# Altium footprint library 5.10-TO直插元件封装.PcbLib: 63 footprints (part 4 of 4)
Each footprint in its own frame and in the unit in brackets; x right, y up, seen from the top. Pads: shape width x height; smd on the part's side, far side on the other; paste and mask are expansions set on the pad; w line width, h text height; cw(c..) or ccw(c..) is an arc to the next point about the centre after c.
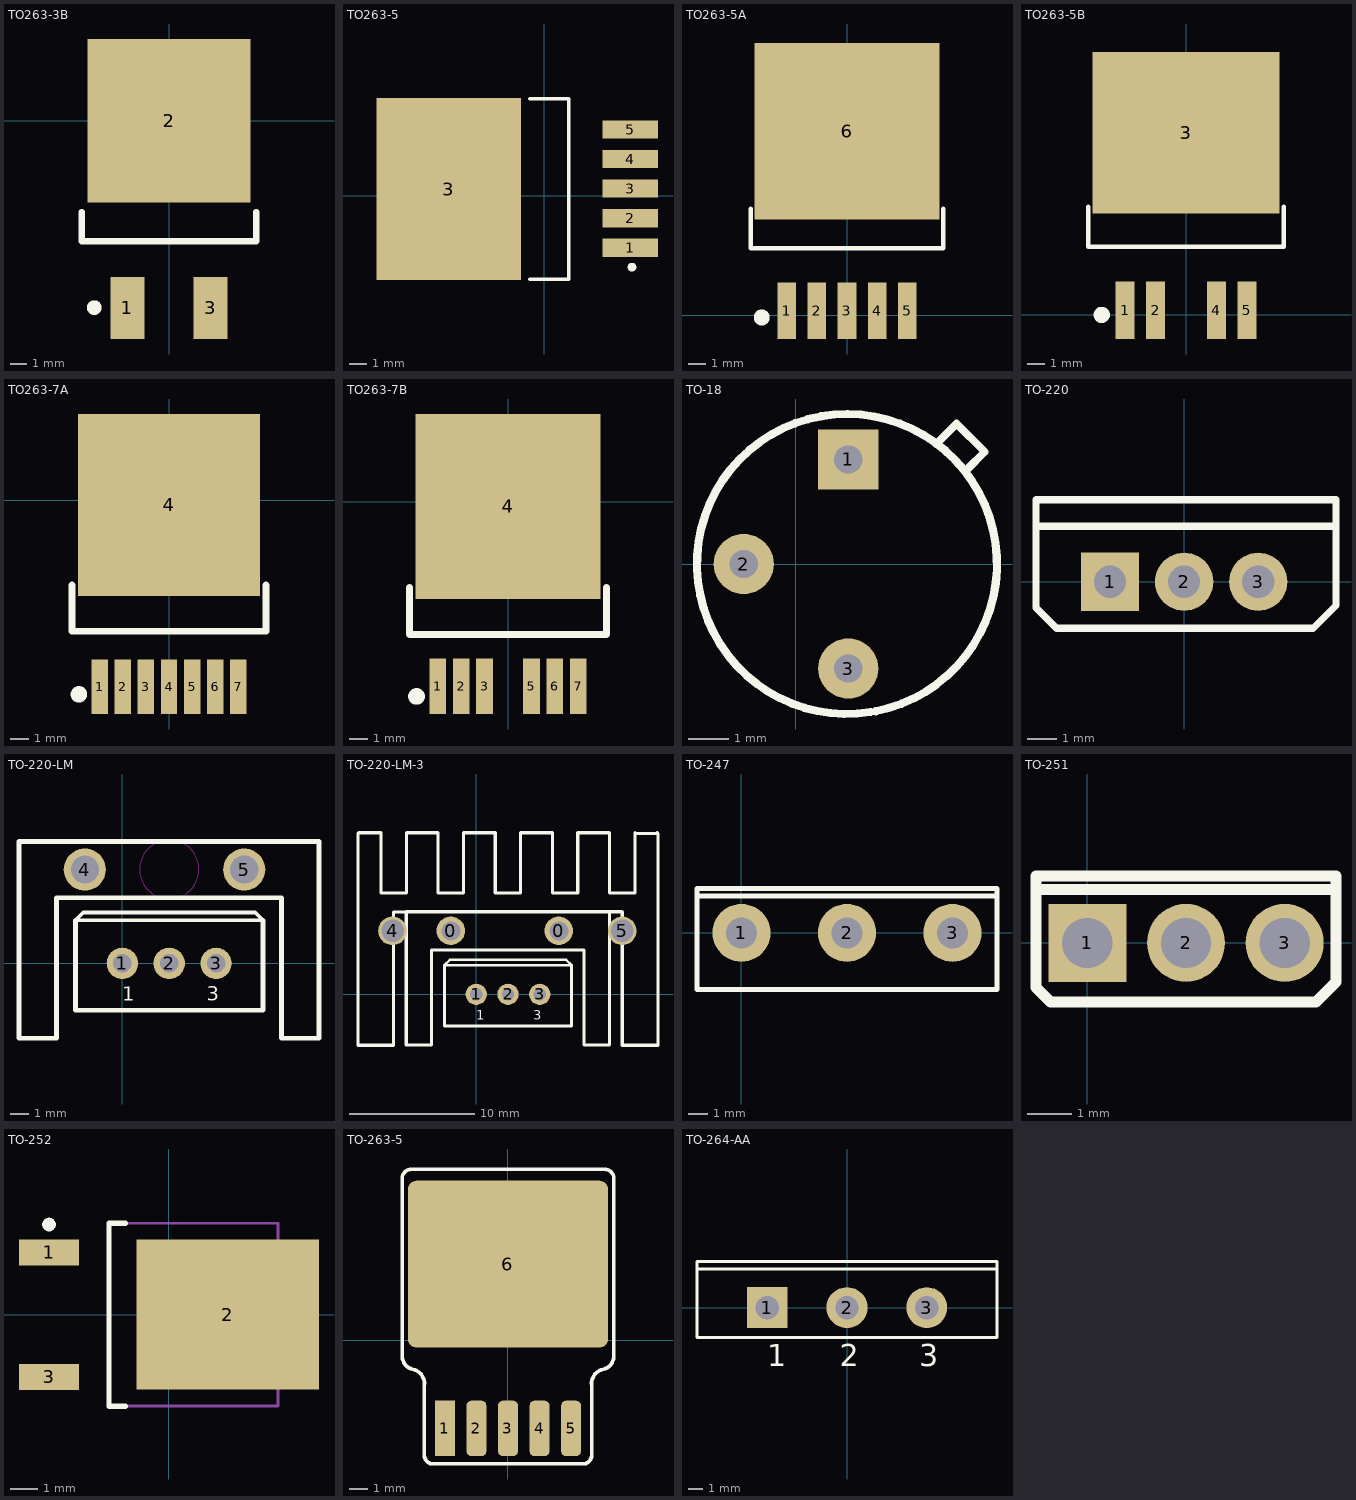
[diagram p3: the footprints below, top view; thin cyan lines are the x and y axes]

## TO263-3B [mm] "263，3脚晶体管      [ PCB学习群514746572 ]"
pads (3):
  rect 2.1x3.8 smd: 1(-2.54,-11.45) 3(2.54,-11.45)
  rect 10x10 smd: 2(0,0)
Top Overlay:
  circle w0.5: c-4.572,-11.43 r0.2
  lines w0.381: -5.334,-5.588 -5.334,-7.366 5.334,-7.366 5.334,-5.588
3D body "TO263-2.STEP": height 5.08, standoff 0.07, extent -4.953,-11.823 5.207,3.441

## TO263-5 [mm] "[ PCBѧϰȺ514746572 ]"
pads (6):
  rect 3.2x1.05 smd: 1(4.953,-2.997) 2(4.953,-1.297) 3(4.953,0.403) 4(4.953,2.103) 5(4.953,3.803)
  rect 8.3x10.45 smd: 3(-5.482,0.381)
Top Overlay:
  circle w0.25: c5.055,-4.115 r0.125
  lines w0.2: -0.83,-4.819 1.42,-4.819 1.42,5.581 -0.83,5.581
3D body "TO263-5A.STEP": height 4.5, standoff 0, extent -8.375,-4.572 4.953,5.428

## TO263-5A [mm] "263，5脚晶体管      [ PCB学习群514746572 ]"
pads (6):
  rect 1.05x3.2 smd: 1(-3.4,0.254) 2(-1.7,0.254) 3(0,0.254) 4(1.7,0.254) 5(3.4,0.254)
  rect 10.45x10 smd: 6(0,10.414)
Top Overlay:
  circle w0.5: c-4.826,-0.127 r0.2
  lines w0.254: -5.461,6.037 -5.461,3.787 5.461,3.787 5.461,6.037
3D body "TO263-5A.STEP": height 4.5, standoff 0, extent -5,0.244 5,13.571

## TO263-5B [mm] "263，5脚晶体管      [ PCB学习群514746572 ]"
pads (5):
  rect 1.05x3.2 smd: 1(-3.4,0.254) 2(-1.7,0.254) 4(1.7,0.254) 5(3.4,0.254)
  rect 10.45x9 smd: 3(0,10.16)
Top Overlay:
  circle w0.5: c-4.699,0 r0.2
  lines w0.254: -5.461,6.037 -5.461,3.787 5.461,3.787 5.461,6.037
3D body "TO263-5B.STEP": height 4.5, standoff 0, extent -5,0.117 5,13.445

## TO263-7A [mm] "263，7脚晶体管      [ PCB学习群514746572 ]"
pads (8):
  rect 0.9x3 smd: 1(-3.81,-10.246) 2(-2.54,-10.246) 3(-1.27,-10.246) 4(0,-10.246) 5(1.27,-10.246) 6(2.54,-10.246) 7(3.81,-10.246)
  rect 10x10 smd: 4(0,-0.254)
Top Overlay:
  circle w0.5: c-4.953,-10.668 r0.2
  lines w0.381: -5.334,-4.658 -5.334,-7.198 5.334,-7.198 5.334,-4.658
3D body "TO263-7A.STEP": height 4.4, standoff 0, extent -5,-10.256 5,3.071

## TO263-7B [mm] "263，7脚晶体管      [ PCB学习群514746572 ]"
pads (7):
  rect 0.9x3 smd: 1(-3.81,-9.992) 2(-2.54,-9.992) 3(-1.27,-9.992) 5(1.27,-9.992) 6(2.54,-9.992) 7(3.81,-9.992)
  rect 10x10 smd: 4(0,-0.254)
Top Overlay:
  circle w0.5: c-4.953,-10.541 r0.2
  lines w0.381: -5.334,-4.658 -5.334,-7.198 5.334,-7.198 5.334,-4.658
3D body "TO263-7B.STEP": height 4.4, standoff 0, extent -5,-10.668 5,2.66

## TO-18 [mm] "[ PCBѧϰȺ514746572 ]"
pads (3):
  rect 1.5x1.5 hole 0.7: 1(1.302,2.603)
  round 1.5 hole 0.7: 2(-1.302,0) 3(1.302,-2.603)
Top Overlay:
  lines w0.2: 3.492,2.984 4,3.492 4.699,2.794 4.255,2.349
  lines w0.203: 1.856,-3.689 cw(c1.27,0) 1.985,-3.666
3D body "TO-18_2n2222.STEP": height 7.6, standoff -0.79, extent -1.657,-2.8 3.951,2.808

## TO-220 [mm] "220，3脚晶体管      [ PCB学习群514746572 ]"
pads (3):
  rect 2x2 hole 1.1: 1(-2.54,0)
  round 2 hole 1.1: 2(0,0) 3(2.54,0)
Top Overlay:
  lines w0.254: -4.928,1.905 5.131,1.905 ; -5.08,-0.889 -5.08,2.819 5.207,2.819 5.207,-0.813 4.42,-1.6 -4.369,-1.6 -5.08,-0.889
3D body "TO220A.STEP": height 18.5, standoff -4, extent -5.15,-1.53 5.15,2.9

## TO-220-LM [mm] "[ PCBѧϰȺ514746572 ]"
pads (5):
  round 1.7 hole 1: 1(0,0) 2(2.54,0) 3(5.08,0)
  round 2.286 hole 1.524: 4(-2.032,5.08) 5(6.604,5.08)
Top Overlay:
  lines w0.2: -2.54,2.328 7.62,2.328 7.197,2.752 -2.117,2.752 -2.54,2.328
  lines w0.254: -2.54,2.328 -2.54,-2.529 -2.529,-2.54 7.609,-2.54 7.62,-2.529 7.62,2.328 ; 10.657,3.556 10.657,6.604 ; 10.657,6.604 10.657,-4.064 8.625,-4.064 8.625,3.556 -3.567,3.556 -3.567,-4.064 -5.599,-4.064 -5.599,1.016 -5.599,3.556 -5.599,6.604 10.657,6.604
  text "3" at 4.572,-2.032 h0.76
  text "1" at 0,-2.032 h0.76
Keep-Out Layer:
  circle w0.025: c2.545,5.094 r1.606
3D body "User Library-Package T0-220AB With Heatsing Vertical Mount-1.STEP": height 21.07, standoff -4.86, extent -5.96,-5.775 11.04,4.445

## TO-220-LM-3 [mil] "[ PCBѧϰȺ514746572 ]"
height 1181.1
pads (7):
  round 90 hole 60: 0(-80,200) 0(260,200)
  round 66.93 hole 39.37: 1(0,0) 2(100,0) 3(200,0)
  round 90 hole 70.87: 4(-263.72,199.65) 5(459.82,199.65)
Top Overlay:
  lines w7.87: -100,91.67 300,91.67 283.33,108.33 -83.33,108.33 -100,91.67
  lines w10: -372.44,379.39 -372.44,507.14 ; -372.44,391.91 -372.44,507.14 ; -100,91.67 -100,-99.56 -99.56,-100 299.56,-100 300,-99.56 300,91.67 ; 419.56,140 419.56,260 ; 459.82,119.65 459.82,199.65 ; 570.28,508.93 572.44,506.77 ; 572.44,387.75 572.44,506.77 ; -372.44,507.14 -370.65,508.93 -300.18,508.93 -300.18,319.39 -220.18,319.39 -220.18,508.93 -120.18,508.93 -120.18,319.39 -40.18,319.39 -40.18,508.93 59.82,508.93 59.82,319.39 139.82,319.39 139.82,508.93 239.82,508.93 239.82,319.39 319.82,319.39 319.82,508.93 399.82,508.93 419.82,508.93 419.82,319.39 499.82,319.39 499.82,508.93 501.97,506.77 572.44,506.77 ; -372.44,507.14 -372.44,-160.61 -260.18,-160.61 -260.18,259.65 -220.78,259.65 -220.44,260 ; -220.44,260 -220.44,140 -220.44,40 -220.44,-160 -140.44,-160 -140.44,140 339.56,140 339.56,-160 419.56,-160 419.56,260 ; -220.44,260 419.56,260 ; 419.56,260 459.47,260 459.82,259.65 459.82,-160.61 572.44,-160.61 572.44,506.77
  text "3" at 180,-80 h30
  text "1" at 0,-80 h30
3D body "TO220A.STEP": height 137.8, standoff -748.03, extent -102.76,-60.24 302.75,114.17

## TO-247 [mm] "[ PCBѧϰȺ514746572 ]"
height 0.9
pads (3):
  round 3 hole 1.6: 1(0,0) 2(5.45,0) 3(10.9,0)
Top Overlay:
  lines w0.254: -2.297,1.905 13.07,1.905 ; -2.297,-2.921 -2.297,2.286 13.197,2.286 13.197,-2.921 -2.297,-2.921
3D body "TO247A.STEP": height 24, standoff -6, extent -2.3,-3 13.2,2

## TO-251 [mil] "[ PCBѧϰȺ514746572 ]"
height 35.43
pads (3):
  rect 70x70 hole 45: 1(0,0)
  round 70 hole 45: 2(88.5,0) 3(177,0)
Top Overlay:
  lines w10: -46,48 222,48 ; -46,-40 -46,60 223,60 223,-35 205,-53 -33,-53 -46,-40
3D body "TO251A.STEP": height 390.23, standoff -196.85, extent -41.42,-41.33 218.42,49.22

## TO-252 [mm] "[ PCBѧϰȺ514746572 ]"
pads (3):
  rect 2.2x0.95 smd: 1(-4.4,2.28) 3(-4.4,-2.28)
  rect 6.7x5.5 smd: 2(2.15,0)
Top Overlay:
  circle w0.25: c-4.4,3.305 r0.125
  lines w0.2: -1.6,-3.35 -2.2,-3.35 -2.2,3.35 -1.6,3.35
Mechanical 13:
  lines w0.1: -2.2,-3.35 4,-3.35 4,3.35 -2.2,3.35 -2.2,-3.35
Mechanical 15:
  lines w0.1: -0.5,0 0.5,0 ; 0,-0.5 0,0.5
3D body "DPAK_TO-252AA.STEP": height 2.5, standoff 0.1, extent -5.082,-3.367 5.018,3.367

## TO-263-5 [mm] "[ PCBѧϰȺ514746572 ]"
pads (6):
  rect 1.07x3 smd: 1(-3.4,-4.75)
  rrect50% 1.07x3 smd: 2(-1.7,-4.75) 3(0,-4.75) 4(1.7,-4.75) 5(3.4,-4.75)
  rrect10% 10.8x9 smd: 6(0,4.115)
Top Overlay:
  lines w0.2: -4.512,-6.122 ccw(c-4.028,-6.181) -4.125,-6.659 ; 4.125,-6.659 ccw(c4.028,-6.181) 4.512,-6.122
  lines w0.203: -5.3,9.23 5.3,9.23 ; -5.299,9.223 ccw(c-5.222,8.741) -5.7,8.839 -5.7,-0.784 ccw(c-5.005,-0.869) -5.145,-1.555 cw(c-5.306,-2.338) -4.512,-2.435 ; -4.512,-6.122 -4.512,-2.181 ; -4.125,-6.659 4.125,-6.659 ; 4.512,-6.122 4.512,-2.181 ; 4.512,-2.435 cw(c5.306,-2.338) 5.145,-1.555 ccw(c5.005,-0.869) 5.7,-0.784 5.7,8.839 ccw(c5.222,8.741) 5.299,9.223
3D body "TO263-5A.STEP": height 4.5, standoff 0, extent -4.953,-5.207 5.047,8.121

## TO-264-AA [mm] "SIP with Mounting Hole; 3 Leads; Body 26 x 20 x 5 mm (typ); Pitch 5.45 mm      [ PCBѧϰȺ514746572 ]"
height 29
pads (3):
  rect 2.8x2.8 hole 1.6: 1(-5.45,0)
  round 2.8 hole 1.6: 2(0,0) 3(5.45,0)
Top Overlay:
  lines w0.2: -10.25,2.65 10.25,2.65 ; -10.25,-2.05 10.25,-2.05 10.25,3.15 -10.25,3.15 -10.25,-2.05
  text "1" at -5.45,-4.025 h1.5
  text "2" at -0.508,-4.025 h1.5
  text "3" at 4.942,-4.025 h1.5
3D body "TO264.STEP": height 32, standoff -7, extent -9.967,-2.941 10.033,2.159